# Altium schematic symbol library jlcpcb_2025_04_capacitors_extended_0402.schlib: 3594 symbols (part 15 of 20) (continued)
## GRM155C80G684KE19D (continued)
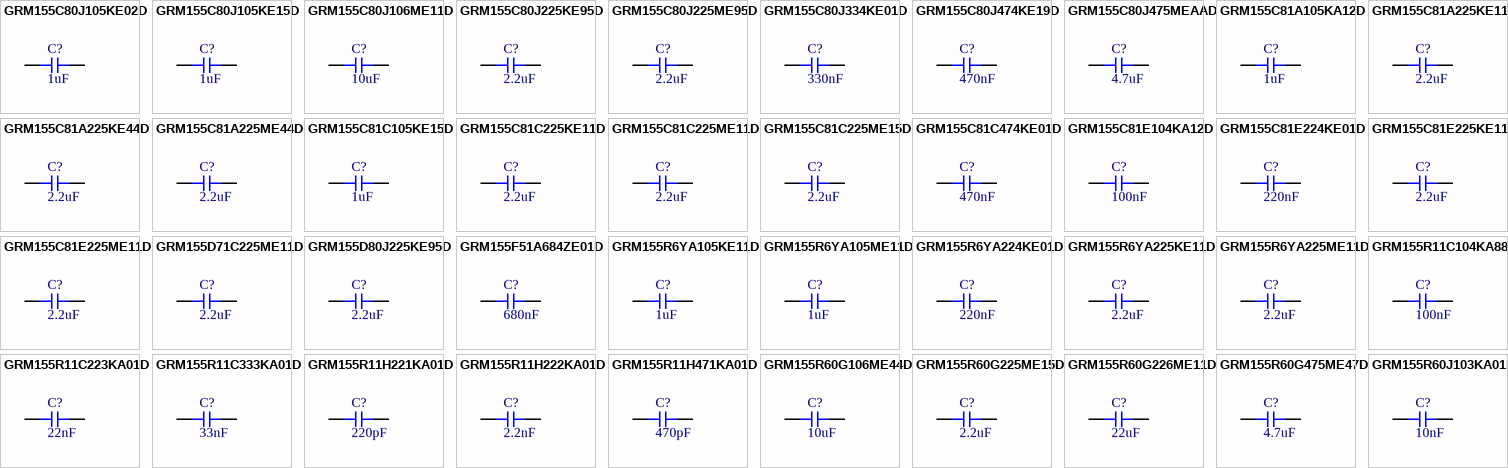
[diagram p66: symbols GRM155C80J105KE02D to GRM155R60J103KA01D]

## GRM155C80J105KE02D
designator C?  Capacitance: 1uF  (hidden comment: *)
Capacitor, Ceramic (MLCC), 1uF, ±10%, ±10%, SMD 0402; Manufacturer: Murata Electronics; Manufacturer Part Number: GRM155C80J105KE02D; Package Size: 0402; JLCPCB Basic Part: No; JLCPCB Part Number: C882537; Supplier 1: LCSC; Category: Capacitors - MLCC; Supplier Part Number 1: C882537; Tolerance: ±10%; RoHS: Yes; ComponentLink1Description: Datasheet; ComponentLink1URL: https://wmsc.lcsc.com/wmsc/upload/file/pdf/v2/lcsc/2201242130_Murata-Electronics-GRM155C80J105KE02D_C882537.pdf; ComponentLink2Description: JLCPCB Part URL; ComponentLink2URL: https://jlcpcb.com/partdetail/C882537; ComponentLink3Description: LCSC Part URL; ComponentLink3URL: https://lcsc.com/product-detail/Multilayer-Ceramic-Capacitors-MLCC---SMD-SMT_Murata-Electronics-Murata-Electronics-GRM155C80J105KE02D_C882537.html
footprint CAP-0402 (0402 (1005M) Capacitor)
pins: 1, 2

## GRM155C80J105KE15D
designator C?  Capacitance: 1uF  (hidden comment: *)
Capacitor, Ceramic (MLCC), 1uF, ±10%, 6.3V, X6S, ±10%, SMD 0402; Manufacturer: Murata Electronics; Manufacturer Part Number: GRM155C80J105KE15D; Package Size: 0402; JLCPCB Basic Part: No; JLCPCB Part Number: C162158; Supplier 1: LCSC; Category: Capacitors - MLCC; Supplier Part Number 1: C162158; Tolerance: ±10%; Voltage Rating: 6.3V; Temperature Coefficient: X6S; RoHS: Yes; ComponentLink1Description: Datasheet; ComponentLink1URL: https://wmsc.lcsc.com/wmsc/upload/file/pdf/v2/lcsc/1912111437_Murata-Electronics-GRM155C80J105KE15D_C162158.pdf; ComponentLink2Description: JLCPCB Part URL; ComponentLink2URL: https://jlcpcb.com/partdetail/C162158; ComponentLink3Description: LCSC Part URL; ComponentLink3URL: https://lcsc.com/product-detail/Multilayer-Ceramic-Capacitors-MLCC---SMD-SMT_Murata-Electronics-Murata-Electronics-GRM155C80J105KE15D_C162158.html
footprint CAP-0402 (0402 (1005M) Capacitor)
pins: 1, 2

## GRM155C80J106ME11D
designator C?  Capacitance: 10uF  (hidden comment: *)
Capacitor, Ceramic (MLCC), 10uF, ±20%, 6.3V, X6S, ±20%, SMD 0402; Manufacturer: Murata Electronics; Manufacturer Part Number: GRM155C80J106ME11D; Package Size: 0402; JLCPCB Basic Part: No; JLCPCB Part Number: C237279; Supplier 1: LCSC; Category: Capacitors - MLCC; Supplier Part Number 1: C237279; Tolerance: ±20%; Voltage Rating: 6.3V; Temperature Coefficient: X6S; RoHS: Yes; ComponentLink1Description: Datasheet; ComponentLink1URL: https://wmsc.lcsc.com/wmsc/upload/file/pdf/v2/lcsc/2304140030_Murata-Electronics-GRM155C80J106ME11D_C237279.pdf; ComponentLink2Description: JLCPCB Part URL; ComponentLink2URL: https://jlcpcb.com/partdetail/C237279; ComponentLink3Description: LCSC Part URL; ComponentLink3URL: https://lcsc.com/product-detail/Multilayer-Ceramic-Capacitors-MLCC---SMD-SMT_Murata-Electronics-Murata-Electronics-GRM155C80J106ME11D_C237279.html
footprint CAP-0402 (0402 (1005M) Capacitor)
pins: 1, 2

## GRM155C80J225KE95D
designator C?  Capacitance: 2.2uF  (hidden comment: *)
Capacitor, Ceramic (MLCC), 2.2uF, ±10%, 6.3V, X6S, ±10%, SMD 0402; Manufacturer: Murata Electronics; Manufacturer Part Number: GRM155C80J225KE95D; Package Size: 0402; JLCPCB Basic Part: No; JLCPCB Part Number: C521077; Supplier 1: LCSC; Category: Capacitors - MLCC; Supplier Part Number 1: C521077; Tolerance: ±10%; Voltage Rating: 6.3V; Temperature Coefficient: X6S; RoHS: Yes; ComponentLink1Description: Datasheet; ComponentLink1URL: https://wmsc.lcsc.com/wmsc/upload/file/pdf/v2/lcsc/2304140030_Murata-Electronics-GRM155C80J225KE95D_C521077.pdf; ComponentLink2Description: JLCPCB Part URL; ComponentLink2URL: https://jlcpcb.com/partdetail/C521077; ComponentLink3Description: LCSC Part URL; ComponentLink3URL: https://lcsc.com/product-detail/Multilayer-Ceramic-Capacitors-MLCC---SMD-SMT_Murata-Electronics-Murata-Electronics-GRM155C80J225KE95D_C521077.html
footprint CAP-0402 (0402 (1005M) Capacitor)
pins: 1, 2

## GRM155C80J225ME95D
designator C?  Capacitance: 2.2uF  (hidden comment: *)
Capacitor, Ceramic (MLCC), 2.2uF, ±20%, 6.3V, X6S, ±20%, SMD 0402; Manufacturer: Murata Electronics; Manufacturer Part Number: GRM155C80J225ME95D; Package Size: 0402; JLCPCB Basic Part: No; JLCPCB Part Number: C464978; Supplier 1: LCSC; Category: Capacitors - MLCC; Supplier Part Number 1: C464978; Tolerance: ±20%; Voltage Rating: 6.3V; Temperature Coefficient: X6S; RoHS: Yes; ComponentLink1Description: Datasheet; ComponentLink1URL: https://wmsc.lcsc.com/wmsc/upload/file/pdf/v2/lcsc/2001071207_Murata-Electronics-GRM155C80J225ME95D_C464978.pdf; ComponentLink2Description: JLCPCB Part URL; ComponentLink2URL: https://jlcpcb.com/partdetail/C464978; ComponentLink3Description: LCSC Part URL; ComponentLink3URL: https://lcsc.com/product-detail/Multilayer-Ceramic-Capacitors-MLCC---SMD-SMT_Murata-Electronics-Murata-Electronics-GRM155C80J225ME95D_C464978.html
footprint CAP-0402 (0402 (1005M) Capacitor)
pins: 1, 2

## GRM155C80J334KE01D
designator C?  Capacitance: 330nF  (hidden comment: *)
Capacitor, Ceramic (MLCC), 330nF, ±10%, 6.3V, X6S, ±10%, SMD 0402; Manufacturer: Murata Electronics; Manufacturer Part Number: GRM155C80J334KE01D; Package Size: 0402; JLCPCB Basic Part: No; JLCPCB Part Number: C913655; Supplier 1: LCSC; Category: Capacitors - MLCC; Supplier Part Number 1: C913655; Tolerance: ±10%; Voltage Rating: 6.3V; Temperature Coefficient: X6S; RoHS: Yes; ComponentLink1Description: Datasheet; ComponentLink1URL: https://wmsc.lcsc.com/wmsc/upload/file/pdf/v2/lcsc/2201131300_Murata-Electronics-GRM155C80J334KE01D_C913655.pdf; ComponentLink2Description: JLCPCB Part URL; ComponentLink2URL: https://jlcpcb.com/partdetail/C913655; ComponentLink3Description: LCSC Part URL; ComponentLink3URL: https://lcsc.com/product-detail/Multilayer-Ceramic-Capacitors-MLCC---SMD-SMT_Murata-Electronics-Murata-Electronics-GRM155C80J334KE01D_C913655.html
footprint CAP-0402 (0402 (1005M) Capacitor)
pins: 1, 2

## GRM155C80J474KE19D
designator C?  Capacitance: 470nF  (hidden comment: *)
Capacitor, Ceramic (MLCC), 470nF, ±10%, 6.3V, X6S, ±10%, SMD 0402; Manufacturer: Murata Electronics; Manufacturer Part Number: GRM155C80J474KE19D; Package Size: 0402; JLCPCB Basic Part: No; JLCPCB Part Number: C162159; Supplier 1: LCSC; Category: Capacitors - MLCC; Supplier Part Number 1: C162159; Tolerance: ±10%; Voltage Rating: 6.3V; Temperature Coefficient: X6S; RoHS: Yes; ComponentLink1Description: Datasheet; ComponentLink1URL: https://wmsc.lcsc.com/wmsc/upload/file/pdf/v2/lcsc/2304140030_Murata-Electronics-GRM155C80J474KE19D_C162159.pdf; ComponentLink2Description: JLCPCB Part URL; ComponentLink2URL: https://jlcpcb.com/partdetail/C162159; ComponentLink3Description: LCSC Part URL; ComponentLink3URL: https://lcsc.com/product-detail/Multilayer-Ceramic-Capacitors-MLCC---SMD-SMT_Murata-Electronics-Murata-Electronics-GRM155C80J474KE19D_C162159.html
footprint CAP-0402 (0402 (1005M) Capacitor)
pins: 1, 2

## GRM155C80J475MEAAD
designator C?  Capacitance: 4.7uF  (hidden comment: *)
Capacitor, Ceramic (MLCC), 4.7uF, ±20%, 6.3V, X6S, ±20%, SMD 0402; Manufacturer: Murata Electronics; Manufacturer Part Number: GRM155C80J475MEAAD; Package Size: 0402; JLCPCB Basic Part: No; JLCPCB Part Number: C464981; Supplier 1: LCSC; Category: Capacitors - MLCC; Supplier Part Number 1: C464981; Tolerance: ±20%; Voltage Rating: 6.3V; Temperature Coefficient: X6S; RoHS: Yes; ComponentLink1Description: Datasheet; ComponentLink1URL: https://wmsc.lcsc.com/wmsc/upload/file/pdf/v2/lcsc/1912111437_Murata-Electronics-GRM155C80J475MEAAD_C464981.pdf; ComponentLink2Description: JLCPCB Part URL; ComponentLink2URL: https://jlcpcb.com/partdetail/C464981; ComponentLink3Description: LCSC Part URL; ComponentLink3URL: https://lcsc.com/product-detail/Multilayer-Ceramic-Capacitors-MLCC---SMD-SMT_Murata-Electronics-Murata-Electronics-GRM155C80J475MEAAD_C464981.html
footprint CAP-0402 (0402 (1005M) Capacitor)
pins: 1, 2

## GRM155C81A105KA12D
designator C?  Capacitance: 1uF  (hidden comment: *)
Capacitor, Ceramic (MLCC), 1uF, ±10%, 10V, X6S, ±10%, SMD 0402; Manufacturer: Murata Electronics; Manufacturer Part Number: GRM155C81A105KA12D; Package Size: 0402; JLCPCB Basic Part: No; JLCPCB Part Number: C162161; Supplier 1: LCSC; Category: Capacitors - MLCC; Supplier Part Number 1: C162161; Tolerance: ±10%; Voltage Rating: 10V; Temperature Coefficient: X6S; RoHS: Yes; ComponentLink1Description: Datasheet; ComponentLink1URL: https://wmsc.lcsc.com/wmsc/upload/file/pdf/v2/lcsc/2201242300_Murata-Electronics-GRM155C81A105KA12D_C162161.pdf; ComponentLink2Description: JLCPCB Part URL; ComponentLink2URL: https://jlcpcb.com/partdetail/C162161; ComponentLink3Description: LCSC Part URL; ComponentLink3URL: https://lcsc.com/product-detail/Multilayer-Ceramic-Capacitors-MLCC---SMD-SMT_Murata-Electronics-Murata-Electronics-GRM155C81A105KA12D_C162161.html
footprint CAP-0402 (0402 (1005M) Capacitor)
pins: 1, 2

## GRM155C81A225KE11D
designator C?  Capacitance: 2.2uF  (hidden comment: *)
Capacitor, Ceramic (MLCC), 2.2uF, ±10%, 10V, X6S, ±10%, SMD 0402; Manufacturer: Murata Electronics; Manufacturer Part Number: GRM155C81A225KE11D; Package Size: 0402; JLCPCB Basic Part: No; JLCPCB Part Number: C464979; Supplier 1: LCSC; Category: Capacitors - MLCC; Supplier Part Number 1: C464979; Tolerance: ±10%; Voltage Rating: 10V; Temperature Coefficient: X6S; RoHS: Yes; ComponentLink1Description: Datasheet; ComponentLink1URL: https://wmsc.lcsc.com/wmsc/upload/file/pdf/v2/lcsc/2001041604_Murata-Electronics-GRM155C81A225KE11D_C464979.pdf; ComponentLink2Description: JLCPCB Part URL; ComponentLink2URL: https://jlcpcb.com/partdetail/C464979; ComponentLink3Description: LCSC Part URL; ComponentLink3URL: https://lcsc.com/product-detail/Multilayer-Ceramic-Capacitors-MLCC---SMD-SMT_Murata-Electronics-Murata-Electronics-GRM155C81A225KE11D_C464979.html
footprint CAP-0402 (0402 (1005M) Capacitor)
pins: 1, 2

## GRM155C81A225KE44D
designator C?  Capacitance: 2.2uF  (hidden comment: *)
Capacitor, Ceramic (MLCC), 2.2uF, ±10%, 10V, X6S, ±10%, SMD 0402; Manufacturer: Murata Electronics; Manufacturer Part Number: GRM155C81A225KE44D; Package Size: 0402; JLCPCB Basic Part: No; JLCPCB Part Number: C576451; Supplier 1: LCSC; Category: Capacitors - MLCC; Supplier Part Number 1: C576451; Tolerance: ±10%; Voltage Rating: 10V; Temperature Coefficient: X6S; RoHS: Yes; ComponentLink1Description: Datasheet; ComponentLink1URL: https://wmsc.lcsc.com/wmsc/upload/file/pdf/v2/lcsc/2308111635_Murata-Electronics-GRM155C81A225KE44D_C576451.pdf; ComponentLink2Description: JLCPCB Part URL; ComponentLink2URL: https://jlcpcb.com/partdetail/C576451; ComponentLink3Description: LCSC Part URL; ComponentLink3URL: https://lcsc.com/product-detail/Multilayer-Ceramic-Capacitors-MLCC---SMD-SMT_Murata-Electronics-Murata-Electronics-GRM155C81A225KE44D_C576451.html
footprint CAP-0402 (0402 (1005M) Capacitor)
pins: 1, 2

## GRM155C81A225ME44D
designator C?  Capacitance: 2.2uF  (hidden comment: *)
Capacitor, Ceramic (MLCC), 2.2uF, ±20%, 10V, X6S, ±20%, SMD 0402; Manufacturer: Murata Electronics; Manufacturer Part Number: GRM155C81A225ME44D; Package Size: 0402; JLCPCB Basic Part: No; JLCPCB Part Number: C710863; Supplier 1: LCSC; Category: Capacitors - MLCC; Supplier Part Number 1: C710863; Tolerance: ±20%; Voltage Rating: 10V; Temperature Coefficient: X6S; RoHS: Yes; ComponentLink1Description: Datasheet; ComponentLink1URL: https://wmsc.lcsc.com/wmsc/upload/file/pdf/v2/lcsc/2210190600_Murata-Electronics-GRM155C81A225ME44D_C710863.pdf; ComponentLink2Description: JLCPCB Part URL; ComponentLink2URL: https://jlcpcb.com/partdetail/C710863; ComponentLink3Description: LCSC Part URL; ComponentLink3URL: https://lcsc.com/product-detail/Multilayer-Ceramic-Capacitors-MLCC---SMD-SMT_Murata-Electronics-Murata-Electronics-GRM155C81A225ME44D_C710863.html
footprint CAP-0402 (0402 (1005M) Capacitor)
pins: 1, 2

## GRM155C81C105KE15D
designator C?  Capacitance: 1uF  (hidden comment: *)
Capacitor, Ceramic (MLCC), 1uF, ±10%, 16V, X6S, ±10%, SMD 0402; Manufacturer: Murata Electronics; Manufacturer Part Number: GRM155C81C105KE15D; Package Size: 0402; JLCPCB Basic Part: No; JLCPCB Part Number: C710864; Supplier 1: LCSC; Category: Capacitors - MLCC; Supplier Part Number 1: C710864; Tolerance: ±10%; Voltage Rating: 16V; Temperature Coefficient: X6S; RoHS: Yes; ComponentLink1Description: Datasheet; ComponentLink1URL: https://wmsc.lcsc.com/wmsc/upload/file/pdf/v2/lcsc/2308111635_Murata-Electronics-GRM155C81C105KE15D_C710864.pdf; ComponentLink2Description: JLCPCB Part URL; ComponentLink2URL: https://jlcpcb.com/partdetail/C710864; ComponentLink3Description: LCSC Part URL; ComponentLink3URL: https://lcsc.com/product-detail/Multilayer-Ceramic-Capacitors-MLCC---SMD-SMT_Murata-Electronics-Murata-Electronics-GRM155C81C105KE15D_C710864.html
footprint CAP-0402 (0402 (1005M) Capacitor)
pins: 1, 2

## GRM155C81C225KE11D
designator C?  Capacitance: 2.2uF  (hidden comment: *)
Capacitor, Ceramic (MLCC), 2.2uF, ±10%, 16V, X6S, ±10%, SMD 0402; Manufacturer: Murata Electronics; Manufacturer Part Number: GRM155C81C225KE11D; Package Size: 0402; JLCPCB Basic Part: No; JLCPCB Part Number: C437523; Supplier 1: LCSC; Category: Capacitors - MLCC; Supplier Part Number 1: C437523; Tolerance: ±10%; Voltage Rating: 16V; Temperature Coefficient: X6S; RoHS: Yes; ComponentLink1Description: Datasheet; ComponentLink1URL: https://wmsc.lcsc.com/wmsc/upload/file/pdf/v2/lcsc/2304140030_Murata-Electronics-GRM155C81C225KE11D_C437523.pdf; ComponentLink2Description: JLCPCB Part URL; ComponentLink2URL: https://jlcpcb.com/partdetail/C437523; ComponentLink3Description: LCSC Part URL; ComponentLink3URL: https://lcsc.com/product-detail/Multilayer-Ceramic-Capacitors-MLCC---SMD-SMT_Murata-Electronics-Murata-Electronics-GRM155C81C225KE11D_C437523.html
footprint CAP-0402 (0402 (1005M) Capacitor)
pins: 1, 2

## GRM155C81C225ME11D
designator C?  Capacitance: 2.2uF  (hidden comment: *)
Capacitor, Ceramic (MLCC), 2.2uF, ±20%, 16V, X6S, ±20%, SMD 0402; Manufacturer: Murata Electronics; Manufacturer Part Number: GRM155C81C225ME11D; Package Size: 0402; JLCPCB Basic Part: No; JLCPCB Part Number: C212615; Supplier 1: LCSC; Category: Capacitors - MLCC; Supplier Part Number 1: C212615; Tolerance: ±20%; Voltage Rating: 16V; Temperature Coefficient: X6S; RoHS: Yes; ComponentLink1Description: Datasheet; ComponentLink1URL: https://wmsc.lcsc.com/wmsc/upload/file/pdf/v2/lcsc/1811081534_Murata-Electronics-GRM155C81C225ME11D_C212615.pdf; ComponentLink2Description: JLCPCB Part URL; ComponentLink2URL: https://jlcpcb.com/partdetail/C212615; ComponentLink3Description: LCSC Part URL; ComponentLink3URL: https://lcsc.com/product-detail/Multilayer-Ceramic-Capacitors-MLCC---SMD-SMT_Murata-Electronics-Murata-Electronics-GRM155C81C225ME11D_C212615.html
footprint CAP-0402 (0402 (1005M) Capacitor)
pins: 1, 2

## GRM155C81C225ME15D
designator C?  Capacitance: 2.2uF  (hidden comment: *)
Capacitor, Ceramic (MLCC), 2.2uF, ±20%, 16V, X6S, ±20%, SMD 0402; Manufacturer: Murata Electronics; Manufacturer Part Number: GRM155C81C225ME15D; Package Size: 0402; JLCPCB Basic Part: No; JLCPCB Part Number: C710865; Supplier 1: LCSC; Category: Capacitors - MLCC; Supplier Part Number 1: C710865; Tolerance: ±20%; Voltage Rating: 16V; Temperature Coefficient: X6S; RoHS: Yes; ComponentLink1Description: Datasheet; ComponentLink1URL: https://wmsc.lcsc.com/wmsc/upload/file/pdf/v2/lcsc/2104301136_Murata-Electronics-GRM155C81C225ME15D_C710865.pdf; ComponentLink2Description: JLCPCB Part URL; ComponentLink2URL: https://jlcpcb.com/partdetail/C710865; ComponentLink3Description: LCSC Part URL; ComponentLink3URL: https://lcsc.com/product-detail/Multilayer-Ceramic-Capacitors-MLCC---SMD-SMT_Murata-Electronics-Murata-Electronics-GRM155C81C225ME15D_C710865.html
footprint CAP-0402 (0402 (1005M) Capacitor)
pins: 1, 2

## GRM155C81C474KE01D
designator C?  Capacitance: 470nF  (hidden comment: *)
Capacitor, Ceramic (MLCC), 470nF, ±10%, 16V, X6S, ±10%, SMD 0402; Manufacturer: Murata Electronics; Manufacturer Part Number: GRM155C81C474KE01D; Package Size: 0402; JLCPCB Basic Part: No; JLCPCB Part Number: C162162; Supplier 1: LCSC; Category: Capacitors - MLCC; Supplier Part Number 1: C162162; Tolerance: ±10%; Voltage Rating: 16V; Temperature Coefficient: X6S; RoHS: Yes; ComponentLink1Description: Datasheet; ComponentLink1URL: https://wmsc.lcsc.com/wmsc/upload/file/pdf/v2/lcsc/2304140030_Murata-Electronics-GRM155C81C474KE01D_C162162.pdf; ComponentLink2Description: JLCPCB Part URL; ComponentLink2URL: https://jlcpcb.com/partdetail/C162162; ComponentLink3Description: LCSC Part URL; ComponentLink3URL: https://lcsc.com/product-detail/Multilayer-Ceramic-Capacitors-MLCC---SMD-SMT_Murata-Electronics-Murata-Electronics-GRM155C81C474KE01D_C162162.html
footprint CAP-0402 (0402 (1005M) Capacitor)
pins: 1, 2

## GRM155C81E104KA12D
designator C?  Capacitance: 100nF  (hidden comment: *)
Capacitor, Ceramic (MLCC), 100nF, ±10%, 25V, X6S, ±10%, SMD 0402; Manufacturer: Murata Electronics; Manufacturer Part Number: GRM155C81E104KA12D; Package Size: 0402; JLCPCB Basic Part: No; JLCPCB Part Number: C141977; Supplier 1: LCSC; Category: Capacitors - MLCC; Supplier Part Number 1: C141977; Tolerance: ±10%; Voltage Rating: 25V; Temperature Coefficient: X6S; RoHS: Yes; ComponentLink1Description: Datasheet; ComponentLink1URL: https://wmsc.lcsc.com/wmsc/upload/file/pdf/v2/lcsc/1811081524_Murata-Electronics-GRM155C81E104KA12D_C141977.pdf; ComponentLink2Description: JLCPCB Part URL; ComponentLink2URL: https://jlcpcb.com/partdetail/C141977; ComponentLink3Description: LCSC Part URL; ComponentLink3URL: https://lcsc.com/product-detail/Multilayer-Ceramic-Capacitors-MLCC---SMD-SMT_Murata-Electronics-Murata-Electronics-GRM155C81E104KA12D_C141977.html
footprint CAP-0402 (0402 (1005M) Capacitor)
pins: 1, 2

## GRM155C81E224KE01D
designator C?  Capacitance: 220nF  (hidden comment: *)
Capacitor, Ceramic (MLCC), 220nF, ±10%, 25V, X6S, ±10%, SMD 0402; Manufacturer: Murata Electronics; Manufacturer Part Number: GRM155C81E224KE01D; Package Size: 0402; JLCPCB Basic Part: No; JLCPCB Part Number: C162163; Supplier 1: LCSC; Category: Capacitors - MLCC; Supplier Part Number 1: C162163; Tolerance: ±10%; Voltage Rating: 25V; Temperature Coefficient: X6S; RoHS: Yes; ComponentLink1Description: Datasheet; ComponentLink1URL: https://wmsc.lcsc.com/wmsc/upload/file/pdf/v2/lcsc/1811081512_Murata-Electronics-GRM155C81E224KE01D_C162163.pdf; ComponentLink2Description: JLCPCB Part URL; ComponentLink2URL: https://jlcpcb.com/partdetail/C162163; ComponentLink3Description: LCSC Part URL; ComponentLink3URL: https://lcsc.com/product-detail/Multilayer-Ceramic-Capacitors-MLCC---SMD-SMT_Murata-Electronics-Murata-Electronics-GRM155C81E224KE01D_C162163.html
footprint CAP-0402 (0402 (1005M) Capacitor)
pins: 1, 2

## GRM155C81E225KE11D
designator C?  Capacitance: 2.2uF  (hidden comment: *)
Capacitor, Ceramic (MLCC), 2.2uF, ±10%, 25V, X6S, ±10%, SMD 0402; Manufacturer: Murata Electronics; Manufacturer Part Number: GRM155C81E225KE11D; Package Size: 0402; JLCPCB Basic Part: No; JLCPCB Part Number: C710866; Supplier 1: LCSC; Category: Capacitors - MLCC; Supplier Part Number 1: C710866; Tolerance: ±10%; Voltage Rating: 25V; Temperature Coefficient: X6S; RoHS: Yes; ComponentLink1Description: Datasheet; ComponentLink1URL: https://wmsc.lcsc.com/wmsc/upload/file/pdf/v2/lcsc/2111111730_Murata-Electronics-GRM155C81E225KE11D_C710866.pdf; ComponentLink2Description: JLCPCB Part URL; ComponentLink2URL: https://jlcpcb.com/partdetail/C710866; ComponentLink3Description: LCSC Part URL; ComponentLink3URL: https://lcsc.com/product-detail/Multilayer-Ceramic-Capacitors-MLCC---SMD-SMT_Murata-Electronics-Murata-Electronics-GRM155C81E225KE11D_C710866.html
footprint CAP-0402 (0402 (1005M) Capacitor)
pins: 1, 2

## GRM155C81E225ME11D
designator C?  Capacitance: 2.2uF  (hidden comment: *)
Capacitor, Ceramic (MLCC), 2.2uF, ±20%, 25V, X6S, ±20%, SMD 0402; Manufacturer: Murata Electronics; Manufacturer Part Number: GRM155C81E225ME11D; Package Size: 0402; JLCPCB Basic Part: No; JLCPCB Part Number: C710867; Supplier 1: LCSC; Category: Capacitors - MLCC; Supplier Part Number 1: C710867; Tolerance: ±20%; Voltage Rating: 25V; Temperature Coefficient: X6S; RoHS: Yes; ComponentLink1Description: Datasheet; ComponentLink1URL: https://wmsc.lcsc.com/wmsc/upload/file/pdf/v2/lcsc/2201131100_Murata-Electronics-GRM155C81E225ME11D_C710867.pdf; ComponentLink2Description: JLCPCB Part URL; ComponentLink2URL: https://jlcpcb.com/partdetail/C710867; ComponentLink3Description: LCSC Part URL; ComponentLink3URL: https://lcsc.com/product-detail/Multilayer-Ceramic-Capacitors-MLCC---SMD-SMT_Murata-Electronics-Murata-Electronics-GRM155C81E225ME11D_C710867.html
footprint CAP-0402 (0402 (1005M) Capacitor)
pins: 1, 2

## GRM155D71C225ME11D
designator C?  Capacitance: 2.2uF  (hidden comment: *)
Capacitor, Ceramic (MLCC), 2.2uF, ±20%, 16V, X7T, ±20%, SMD 0402; Manufacturer: Murata Electronics; Manufacturer Part Number: GRM155D71C225ME11D; Package Size: 0402; JLCPCB Basic Part: No; JLCPCB Part Number: C668350; Supplier 1: LCSC; Category: Capacitors - MLCC; Supplier Part Number 1: C668350; Tolerance: ±20%; Voltage Rating: 16V; Temperature Coefficient: X7T; RoHS: Yes; ComponentLink1Description: Datasheet; ComponentLink1URL: https://wmsc.lcsc.com/wmsc/upload/file/pdf/v2/lcsc/2109092030_Murata-Electronics-GRM155D71C225ME11D_C668350.pdf; ComponentLink2Description: JLCPCB Part URL; ComponentLink2URL: https://jlcpcb.com/partdetail/C668350; ComponentLink3Description: LCSC Part URL; ComponentLink3URL: https://lcsc.com/product-detail/Multilayer-Ceramic-Capacitors-MLCC---SMD-SMT_Murata-Electronics-Murata-Electronics-GRM155D71C225ME11D_C668350.html
footprint CAP-0402 (0402 (1005M) Capacitor)
pins: 1, 2

## GRM155D80J225KE95D
designator C?  Capacitance: 2.2uF  (hidden comment: *)
Capacitor, Ceramic (MLCC), 2.2uF, ±10%, 6.3V, X6T, ±10%, SMD 0402; Manufacturer: Murata Electronics; Manufacturer Part Number: GRM155D80J225KE95D; Package Size: 0402; JLCPCB Basic Part: No; JLCPCB Part Number: C907753; Supplier 1: LCSC; Category: Capacitors - MLCC; Supplier Part Number 1: C907753; Tolerance: ±10%; Voltage Rating: 6.3V; Temperature Coefficient: X6T; RoHS: Yes; ComponentLink1Description: Datasheet; ComponentLink1URL: https://wmsc.lcsc.com/wmsc/upload/file/pdf/v2/lcsc/2201242100_Murata-Electronics-GRM155D80J225KE95D_C907753.pdf; ComponentLink2Description: JLCPCB Part URL; ComponentLink2URL: https://jlcpcb.com/partdetail/C907753; ComponentLink3Description: LCSC Part URL; ComponentLink3URL: https://lcsc.com/product-detail/Multilayer-Ceramic-Capacitors-MLCC---SMD-SMT_Murata-Electronics-Murata-Electronics-GRM155D80J225KE95D_C907753.html
footprint CAP-0402 (0402 (1005M) Capacitor)
pins: 1, 2

## GRM155F51A684ZE01D
designator C?  Capacitance: 680nF  (hidden comment: *)
Capacitor, Ceramic (MLCC), 680nF, 10V, SMD 0402; Manufacturer: Murata Electronics; Manufacturer Part Number: GRM155F51A684ZE01D; Temperature Rating: -20%~+80%; Package Size: 0402; JLCPCB Basic Part: No; JLCPCB Part Number: C426052; Supplier 1: LCSC; Category: Capacitors - MLCC; Supplier Part Number 1: C426052; Voltage Rating: 10V; RoHS: Yes; ComponentLink1Description: Datasheet; ComponentLink1URL: https://wmsc.lcsc.com/wmsc/upload/file/pdf/v2/lcsc/2304140030_Murata-Electronics-GRM155F51A684ZE01D_C426052.pdf; ComponentLink2Description: JLCPCB Part URL; ComponentLink2URL: https://jlcpcb.com/partdetail/C426052; ComponentLink3Description: LCSC Part URL; ComponentLink3URL: https://lcsc.com/product-detail/Multilayer-Ceramic-Capacitors-MLCC---SMD-SMT_Murata-Electronics-Murata-Electronics-GRM155F51A684ZE01D_C426052.html
footprint CAP-0402 (0402 (1005M) Capacitor)
pins: 1, 2

## GRM155R6YA105KE11D
designator C?  Capacitance: 1uF  (hidden comment: *)
Capacitor, Ceramic (MLCC), 1uF, ±10%, 35V, X5R, ±10%, SMD 0402; Manufacturer: Murata Electronics; Manufacturer Part Number: GRM155R6YA105KE11D; Package Size: 0402; JLCPCB Basic Part: No; JLCPCB Part Number: C361059; Supplier 1: LCSC; Category: Capacitors - MLCC; Supplier Part Number 1: C361059; Tolerance: ±10%; Voltage Rating: 35V; Temperature Coefficient: X5R; RoHS: Yes; ComponentLink1Description: Datasheet; ComponentLink1URL: https://wmsc.lcsc.com/wmsc/upload/file/pdf/v2/lcsc/2012102138_Murata-Electronics-GRM155R6YA105KE11D_C361059.pdf; ComponentLink2Description: JLCPCB Part URL; ComponentLink2URL: https://jlcpcb.com/partdetail/C361059; ComponentLink3Description: LCSC Part URL; ComponentLink3URL: https://lcsc.com/product-detail/Multilayer-Ceramic-Capacitors-MLCC---SMD-SMT_Murata-Electronics-Murata-Electronics-GRM155R6YA105KE11D_C361059.html
footprint CAP-0402 (0402 (1005M) Capacitor)
pins: 1, 2

## GRM155R6YA105ME11D
designator C?  Capacitance: 1uF  (hidden comment: *)
Capacitor, Ceramic (MLCC), 1uF, ±20%, 35V, X5R, ±20%, SMD 0402; Manufacturer: Murata Electronics; Manufacturer Part Number: GRM155R6YA105ME11D; Package Size: 0402; JLCPCB Basic Part: No; JLCPCB Part Number: C910755; Supplier 1: LCSC; Category: Capacitors - MLCC; Supplier Part Number 1: C910755; Tolerance: ±20%; Voltage Rating: 35V; Temperature Coefficient: X5R; RoHS: Yes; ComponentLink1Description: Datasheet; ComponentLink1URL: https://wmsc.lcsc.com/wmsc/upload/file/pdf/v2/lcsc/2104271833_Murata-Electronics-GRM155R6YA105ME11D_C910755.pdf; ComponentLink2Description: JLCPCB Part URL; ComponentLink2URL: https://jlcpcb.com/partdetail/C910755; ComponentLink3Description: LCSC Part URL; ComponentLink3URL: https://lcsc.com/product-detail/Multilayer-Ceramic-Capacitors-MLCC---SMD-SMT_Murata-Electronics-Murata-Electronics-GRM155R6YA105ME11D_C910755.html
footprint CAP-0402 (0402 (1005M) Capacitor)
pins: 1, 2

## GRM155R6YA224KE01D
designator C?  Capacitance: 220nF  (hidden comment: *)
Capacitor, Ceramic (MLCC), 220nF, ±10%, 35V, X5R, ±10%, SMD 0402; Manufacturer: Murata Electronics; Manufacturer Part Number: GRM155R6YA224KE01D; Package Size: 0402; JLCPCB Basic Part: No; JLCPCB Part Number: C162180; Supplier 1: LCSC; Category: Capacitors - MLCC; Supplier Part Number 1: C162180; Tolerance: ±10%; Voltage Rating: 35V; Temperature Coefficient: X5R; RoHS: Yes; ComponentLink1Description: Datasheet; ComponentLink1URL: https://wmsc.lcsc.com/wmsc/upload/file/pdf/v2/lcsc/1811081513_Murata-Electronics-GRM155R6YA224KE01D_C162180.pdf; ComponentLink2Description: JLCPCB Part URL; ComponentLink2URL: https://jlcpcb.com/partdetail/C162180; ComponentLink3Description: LCSC Part URL; ComponentLink3URL: https://lcsc.com/product-detail/Multilayer-Ceramic-Capacitors-MLCC---SMD-SMT_Murata-Electronics-Murata-Electronics-GRM155R6YA224KE01D_C162180.html
footprint CAP-0402 (0402 (1005M) Capacitor)
pins: 1, 2

## GRM155R6YA225KE11D
designator C?  Capacitance: 2.2uF  (hidden comment: *)
Capacitor, Ceramic (MLCC), 2.2uF, ±10%, 35V, X5R, ±10%, SMD 0402; Manufacturer: Murata Electronics; Manufacturer Part Number: GRM155R6YA225KE11D; Package Size: 0402; JLCPCB Basic Part: No; JLCPCB Part Number: C237392; Supplier 1: LCSC; Category: Capacitors - MLCC; Supplier Part Number 1: C237392; Tolerance: ±10%; Voltage Rating: 35V; Temperature Coefficient: X5R; RoHS: Yes; ComponentLink1Description: Datasheet; ComponentLink1URL: https://wmsc.lcsc.com/wmsc/upload/file/pdf/v2/lcsc/2304140030_Murata-Electronics-GRM155R6YA225KE11D_C237392.pdf; ComponentLink2Description: JLCPCB Part URL; ComponentLink2URL: https://jlcpcb.com/partdetail/C237392; ComponentLink3Description: LCSC Part URL; ComponentLink3URL: https://lcsc.com/product-detail/Multilayer-Ceramic-Capacitors-MLCC---SMD-SMT_Murata-Electronics-Murata-Electronics-GRM155R6YA225KE11D_C237392.html
footprint CAP-0402 (0402 (1005M) Capacitor)
pins: 1, 2

## GRM155R6YA225ME11D
designator C?  Capacitance: 2.2uF  (hidden comment: *)
Capacitor, Ceramic (MLCC), 2.2uF, ±20%, 35V, X5R, ±20%, SMD 0402; Manufacturer: Murata Electronics; Manufacturer Part Number: GRM155R6YA225ME11D; Package Size: 0402; JLCPCB Basic Part: No; JLCPCB Part Number: C710880; Supplier 1: LCSC; Category: Capacitors - MLCC; Supplier Part Number 1: C710880; Tolerance: ±20%; Voltage Rating: 35V; Temperature Coefficient: X5R; RoHS: Yes; ComponentLink1Description: Datasheet; ComponentLink1URL: https://wmsc.lcsc.com/wmsc/upload/file/pdf/v2/lcsc/2210190600_Murata-Electronics-GRM155R6YA225ME11D_C710880.pdf; ComponentLink2Description: JLCPCB Part URL; ComponentLink2URL: https://jlcpcb.com/partdetail/C710880; ComponentLink3Description: LCSC Part URL; ComponentLink3URL: https://lcsc.com/product-detail/Multilayer-Ceramic-Capacitors-MLCC---SMD-SMT_Murata-Electronics-Murata-Electronics-GRM155R6YA225ME11D_C710880.html
footprint CAP-0402 (0402 (1005M) Capacitor)
pins: 1, 2

## GRM155R11C104KA88D
designator C?  Capacitance: 100nF  (hidden comment: *)
Capacitor, Ceramic (MLCC), 100nF, ±10%, 16V, R, ±10%, SMD 0402; Manufacturer: Murata Electronics; Manufacturer Part Number: GRM155R11C104KA88D; Package Size: 0402; JLCPCB Basic Part: No; JLCPCB Part Number: C464413; Supplier 1: LCSC; Category: Capacitors - MLCC; Supplier Part Number 1: C464413; Tolerance: ±10%; Voltage Rating: 16V; Temperature Coefficient: R; RoHS: Yes; ComponentLink1Description: Datasheet; ComponentLink1URL: https://wmsc.lcsc.com/wmsc/upload/file/pdf/v2/lcsc/2304140030_Murata-Electronics-GRM155R11C104KA88D_C464413.pdf; ComponentLink2Description: JLCPCB Part URL; ComponentLink2URL: https://jlcpcb.com/partdetail/C464413; ComponentLink3Description: LCSC Part URL; ComponentLink3URL: https://lcsc.com/product-detail/Multilayer-Ceramic-Capacitors-MLCC---SMD-SMT_Murata-Electronics-Murata-Electronics-GRM155R11C104KA88D_C464413.html
footprint CAP-0402 (0402 (1005M) Capacitor)
pins: 1, 2

## GRM155R11C223KA01D
designator C?  Capacitance: 22nF  (hidden comment: *)
Capacitor, Ceramic (MLCC), 22nF, ±10%, 16V, ±10%, SMD 0402; Manufacturer: Murata Electronics; Manufacturer Part Number: GRM155R11C223KA01D; Package Size: 0402; JLCPCB Basic Part: No; JLCPCB Part Number: C576453; Supplier 1: LCSC; Category: Capacitors - MLCC; Supplier Part Number 1: C576453; Tolerance: ±10%; Voltage Rating: 16V; RoHS: Yes; ComponentLink1Description: Datasheet; ComponentLink1URL: https://wmsc.lcsc.com/wmsc/upload/file/pdf/v2/lcsc/2109092030_Murata-Electronics-GRM155R11C223KA01D_C576453.pdf; ComponentLink2Description: JLCPCB Part URL; ComponentLink2URL: https://jlcpcb.com/partdetail/C576453; ComponentLink3Description: LCSC Part URL; ComponentLink3URL: https://lcsc.com/product-detail/Multilayer-Ceramic-Capacitors-MLCC---SMD-SMT_Murata-Electronics-Murata-Electronics-GRM155R11C223KA01D_C576453.html
footprint CAP-0402 (0402 (1005M) Capacitor)
pins: 1, 2

## GRM155R11C333KA01D
designator C?  Capacitance: 33nF  (hidden comment: *)
Capacitor, Ceramic (MLCC), 33nF, ±10%, 16V, R, ±10%, SMD 0402; Manufacturer: Murata Electronics; Manufacturer Part Number: GRM155R11C333KA01D; Package Size: 0402; JLCPCB Basic Part: No; JLCPCB Part Number: C471375; Supplier 1: LCSC; Category: Capacitors - MLCC; Supplier Part Number 1: C471375; Tolerance: ±10%; Voltage Rating: 16V; Temperature Coefficient: R; RoHS: Yes; ComponentLink1Description: Datasheet; ComponentLink1URL: https://wmsc.lcsc.com/wmsc/upload/file/pdf/v2/lcsc/2308111635_Murata-Electronics-GRM155R11C333KA01D_C471375.pdf; ComponentLink2Description: JLCPCB Part URL; ComponentLink2URL: https://jlcpcb.com/partdetail/C471375; ComponentLink3Description: LCSC Part URL; ComponentLink3URL: https://lcsc.com/product-detail/Multilayer-Ceramic-Capacitors-MLCC---SMD-SMT_Murata-Electronics-Murata-Electronics-GRM155R11C333KA01D_C471375.html
footprint CAP-0402 (0402 (1005M) Capacitor)
pins: 1, 2

## GRM155R11H221KA01D
designator C?  Capacitance: 220pF  (hidden comment: *)
Capacitor, Ceramic (MLCC), 220pF, ±10%, 50V, X7R, ±10%, SMD 0402; Manufacturer: Murata Electronics; Manufacturer Part Number: GRM155R11H221KA01D; Package Size: 0402; JLCPCB Basic Part: No; JLCPCB Part Number: C162166; Supplier 1: LCSC; Category: Capacitors - MLCC; Supplier Part Number 1: C162166; Tolerance: ±10%; Voltage Rating: 50V; Temperature Coefficient: X7R; RoHS: Yes; ComponentLink1Description: Datasheet; ComponentLink1URL: https://wmsc.lcsc.com/wmsc/upload/file/pdf/v2/lcsc/2108182030_Murata-Electronics-GRM155R11H221KA01D_C162166.pdf; ComponentLink2Description: JLCPCB Part URL; ComponentLink2URL: https://jlcpcb.com/partdetail/C162166; ComponentLink3Description: LCSC Part URL; ComponentLink3URL: https://lcsc.com/product-detail/Multilayer-Ceramic-Capacitors-MLCC---SMD-SMT_Murata-Electronics-Murata-Electronics-GRM155R11H221KA01D_C162166.html
footprint CAP-0402 (0402 (1005M) Capacitor)
pins: 1, 2

## GRM155R11H222KA01D
designator C?  Capacitance: 2.2nF  (hidden comment: *)
Capacitor, Ceramic (MLCC), 2.2nF, ±10%, ±10%, SMD 0402; Manufacturer: Murata Electronics; Manufacturer Part Number: GRM155R11H222KA01D; Package Size: 0402; JLCPCB Basic Part: No; JLCPCB Part Number: C576456; Supplier 1: LCSC; Category: Capacitors - MLCC; Supplier Part Number 1: C576456; Tolerance: ±10%; RoHS: Yes; ComponentLink1Description: Datasheet; ComponentLink1URL: https://wmsc.lcsc.com/wmsc/upload/file/pdf/v2/lcsc/2105241310_Murata-Electronics-GRM155R11H222KA01D_C576456.pdf; ComponentLink2Description: JLCPCB Part URL; ComponentLink2URL: https://jlcpcb.com/partdetail/C576456; ComponentLink3Description: LCSC Part URL; ComponentLink3URL: https://lcsc.com/product-detail/Multilayer-Ceramic-Capacitors-MLCC---SMD-SMT_Murata-Electronics-Murata-Electronics-GRM155R11H222KA01D_C576456.html
footprint CAP-0402 (0402 (1005M) Capacitor)
pins: 1, 2

## GRM155R11H471KA01D
designator C?  Capacitance: 470pF  (hidden comment: *)
Capacitor, Ceramic (MLCC), 470pF, ±10%, 50V, ±10%, SMD 0402; Manufacturer: Murata Electronics; Manufacturer Part Number: GRM155R11H471KA01D; Package Size: 0402; JLCPCB Basic Part: No; JLCPCB Part Number: C576458; Supplier 1: LCSC; Category: Capacitors - MLCC; Supplier Part Number 1: C576458; Tolerance: ±10%; Voltage Rating: 50V; RoHS: Yes; ComponentLink1Description: Datasheet; ComponentLink1URL: https://wmsc.lcsc.com/wmsc/upload/file/pdf/v2/lcsc/2108182030_Murata-Electronics-GRM155R11H471KA01D_C576458.pdf; ComponentLink2Description: JLCPCB Part URL; ComponentLink2URL: https://jlcpcb.com/partdetail/C576458; ComponentLink3Description: LCSC Part URL; ComponentLink3URL: https://lcsc.com/product-detail/Multilayer-Ceramic-Capacitors-MLCC---SMD-SMT_Murata-Electronics-Murata-Electronics-GRM155R11H471KA01D_C576458.html
footprint CAP-0402 (0402 (1005M) Capacitor)
pins: 1, 2

## GRM155R60G106ME44D
designator C?  Capacitance: 10uF  (hidden comment: *)
Capacitor, Ceramic (MLCC), 10uF, ±20%, 4V, X5R, ±20%, SMD 0402; Manufacturer: Murata Electronics; Manufacturer Part Number: GRM155R60G106ME44D; Package Size: 0402; JLCPCB Basic Part: No; JLCPCB Part Number: C162167; Supplier 1: LCSC; Category: Capacitors - MLCC; Supplier Part Number 1: C162167; Tolerance: ±20%; Voltage Rating: 4V; Temperature Coefficient: X5R; RoHS: Yes; ComponentLink1Description: Datasheet; ComponentLink1URL: https://wmsc.lcsc.com/wmsc/upload/file/pdf/v2/lcsc/1811081530_Murata-Electronics-GRM155R60G106ME44D_C162167.pdf; ComponentLink2Description: JLCPCB Part URL; ComponentLink2URL: https://jlcpcb.com/partdetail/C162167; ComponentLink3Description: LCSC Part URL; ComponentLink3URL: https://lcsc.com/product-detail/Multilayer-Ceramic-Capacitors-MLCC---SMD-SMT_Murata-Electronics-Murata-Electronics-GRM155R60G106ME44D_C162167.html
footprint CAP-0402 (0402 (1005M) Capacitor)
pins: 1, 2

## GRM155R60G225ME15D
designator C?  Capacitance: 2.2uF  (hidden comment: *)
Capacitor, Ceramic (MLCC), 2.2uF, ±20%, 4V, X5R, ±20%, SMD 0402; Manufacturer: Murata Electronics; Manufacturer Part Number: GRM155R60G225ME15D; Package Size: 0402; JLCPCB Basic Part: No; JLCPCB Part Number: C441736; Supplier 1: LCSC; Category: Capacitors - MLCC; Supplier Part Number 1: C441736; Tolerance: ±20%; Voltage Rating: 4V; Temperature Coefficient: X5R; RoHS: Yes; ComponentLink1Description: Datasheet; ComponentLink1URL: https://wmsc.lcsc.com/wmsc/upload/file/pdf/v2/lcsc/2304140030_Murata-Electronics-GRM155R60G225ME15D_C441736.pdf; ComponentLink2Description: JLCPCB Part URL; ComponentLink2URL: https://jlcpcb.com/partdetail/C441736; ComponentLink3Description: LCSC Part URL; ComponentLink3URL: https://lcsc.com/product-detail/Multilayer-Ceramic-Capacitors-MLCC---SMD-SMT_Murata-Electronics-Murata-Electronics-GRM155R60G225ME15D_C441736.html
footprint CAP-0402 (0402 (1005M) Capacitor)
pins: 1, 2

## GRM155R60G226ME11D
designator C?  Capacitance: 22uF  (hidden comment: *)
Capacitor, Ceramic (MLCC), 22uF, ±20%, ±20%, SMD 0402; Manufacturer: Murata Electronics; Manufacturer Part Number: GRM155R60G226ME11D; Package Size: 0402; JLCPCB Basic Part: No; JLCPCB Part Number: C2929204; Supplier 1: LCSC; Category: Capacitors - MLCC; Supplier Part Number 1: C2929204; Tolerance: ±20%; RoHS: Yes; ComponentLink1Description: Datasheet; ComponentLink1URL: https://wmsc.lcsc.com/wmsc/upload/file/pdf/v2/lcsc/2201121400_Murata-Electronics-GRM155R60G226ME11D_C2929204.pdf; ComponentLink2Description: JLCPCB Part URL; ComponentLink2URL: https://jlcpcb.com/partdetail/C2929204; ComponentLink3Description: LCSC Part URL; ComponentLink3URL: https://lcsc.com/product-detail/Multilayer-Ceramic-Capacitors-MLCC---SMD-SMT_Murata-Electronics-Murata-Electronics-GRM155R60G226ME11D_C2929204.html
footprint CAP-0402 (0402 (1005M) Capacitor)
pins: 1, 2

## GRM155R60G475ME47D
designator C?  Capacitance: 4.7uF  (hidden comment: *)
Capacitor, Ceramic (MLCC), 4.7uF, ±20%, 4V, X5R, ±20%, SMD 0402; Manufacturer: Murata Electronics; Manufacturer Part Number: GRM155R60G475ME47D; Package Size: 0402; JLCPCB Basic Part: No; JLCPCB Part Number: C76990; Supplier 1: LCSC; Category: Capacitors - MLCC; Supplier Part Number 1: C76990; Tolerance: ±20%; Voltage Rating: 4V; Temperature Coefficient: X5R; RoHS: Yes; ComponentLink1Description: Datasheet; ComponentLink1URL: https://wmsc.lcsc.com/wmsc/upload/file/pdf/v2/lcsc/1811081613_Murata-Electronics-GRM155R60G475ME47D_C76990.pdf; ComponentLink2Description: JLCPCB Part URL; ComponentLink2URL: https://jlcpcb.com/partdetail/C76990; ComponentLink3Description: LCSC Part URL; ComponentLink3URL: https://lcsc.com/product-detail/Multilayer-Ceramic-Capacitors-MLCC---SMD-SMT_Murata-Electronics-Murata-Electronics-GRM155R60G475ME47D_C76990.html
footprint CAP-0402 (0402 (1005M) Capacitor)
pins: 1, 2

## GRM155R60J103KA01D
designator C?  Capacitance: 10nF  (hidden comment: *)
Capacitor, Ceramic (MLCC), 10nF, ±10%, 6.3V, X5R, ±10%, SMD 0402; Manufacturer: Murata Electronics; Manufacturer Part Number: GRM155R60J103KA01D; Package Size: 0402; JLCPCB Basic Part: No; JLCPCB Part Number: C710872; Supplier 1: LCSC; Category: Capacitors - MLCC; Supplier Part Number 1: C710872; Tolerance: ±10%; Voltage Rating: 6.3V; Temperature Coefficient: X5R; RoHS: Yes; ComponentLink1Description: Datasheet; ComponentLink1URL: https://wmsc.lcsc.com/wmsc/upload/file/pdf/v2/lcsc/2107272240_Murata-Electronics-GRM155R60J103KA01D_C710872.pdf; ComponentLink2Description: JLCPCB Part URL; ComponentLink2URL: https://jlcpcb.com/partdetail/C710872; ComponentLink3Description: LCSC Part URL; ComponentLink3URL: https://lcsc.com/product-detail/Multilayer-Ceramic-Capacitors-MLCC---SMD-SMT_Murata-Electronics-Murata-Electronics-GRM155R60J103KA01D_C710872.html
footprint CAP-0402 (0402 (1005M) Capacitor)
pins: 1, 2

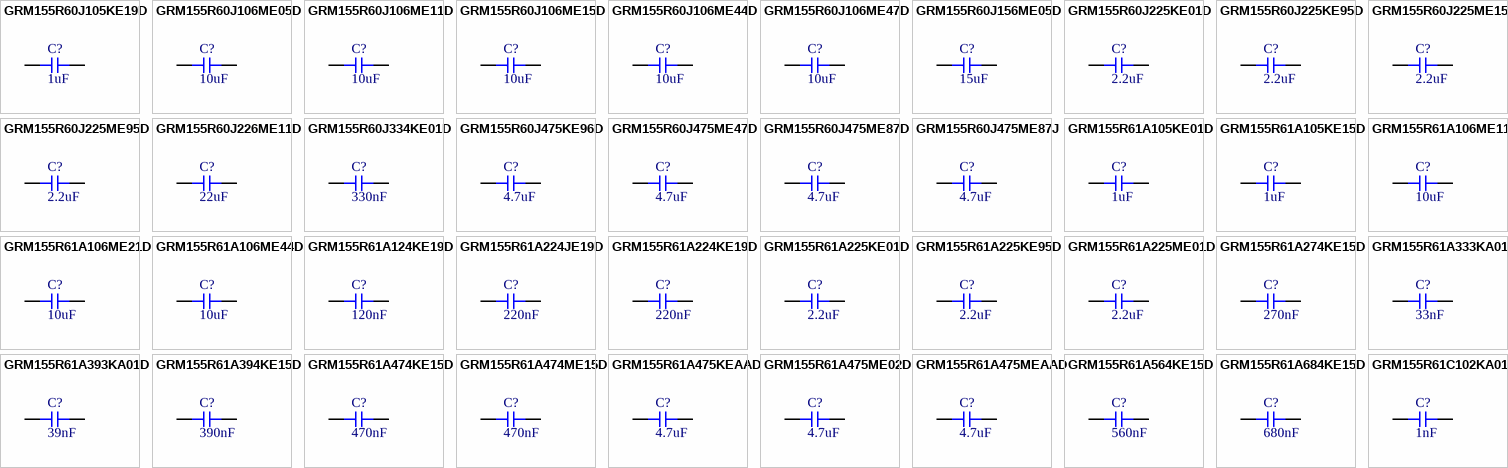
[diagram p67: symbols GRM155R60J105KE19D to GRM155R61C102KA01D]

## GRM155R60J105KE19D
designator C?  Capacitance: 1uF  (hidden comment: *)
Capacitor, Ceramic (MLCC), 1uF, ±10%, 6.3V, X5R, ±10%, SMD 0402; Manufacturer: Murata Electronics; Manufacturer Part Number: GRM155R60J105KE19D; Package Size: 0402; JLCPCB Basic Part: No; JLCPCB Part Number: C15684; Supplier 1: LCSC; Category: Capacitors - MLCC; Supplier Part Number 1: C15684; Tolerance: ±10%; Voltage Rating: 6.3V; Temperature Coefficient: X5R; RoHS: Yes; ComponentLink1Description: Datasheet; ComponentLink1URL: https://wmsc.lcsc.com/wmsc/upload/file/pdf/v2/lcsc/1811081610_Murata-Electronics-GRM155R60J105KE19D_C15684.pdf; ComponentLink2Description: JLCPCB Part URL; ComponentLink2URL: https://jlcpcb.com/partdetail/C15684; ComponentLink3Description: LCSC Part URL; ComponentLink3URL: https://lcsc.com/product-detail/Multilayer-Ceramic-Capacitors-MLCC---SMD-SMT_Murata-Electronics-Murata-Electronics-GRM155R60J105KE19D_C15684.html
footprint CAP-0402 (0402 (1005M) Capacitor)
pins: 1, 2

## GRM155R60J106ME05D
designator C?  Capacitance: 10uF  (hidden comment: *)
Capacitor, Ceramic (MLCC), 10uF, ±20%, 6.3V, X5R, ±20%, SMD 0402; Manufacturer: Murata Electronics; Manufacturer Part Number: GRM155R60J106ME05D; Package Size: 0402; JLCPCB Basic Part: No; JLCPCB Part Number: C723895; Supplier 1: LCSC; Category: Capacitors - MLCC; Supplier Part Number 1: C723895; Tolerance: ±20%; Voltage Rating: 6.3V; Temperature Coefficient: X5R; RoHS: Yes; ComponentLink1Description: Datasheet; ComponentLink1URL: https://wmsc.lcsc.com/wmsc/upload/file/pdf/v2/lcsc/2008241234_Murata-Electronics-GRM155R60J106ME05D_C723895.pdf; ComponentLink2Description: JLCPCB Part URL; ComponentLink2URL: https://jlcpcb.com/partdetail/C723895; ComponentLink3Description: LCSC Part URL; ComponentLink3URL: https://lcsc.com/product-detail/Multilayer-Ceramic-Capacitors-MLCC---SMD-SMT_Murata-Electronics-Murata-Electronics-GRM155R60J106ME05D_C723895.html
footprint CAP-0402 (0402 (1005M) Capacitor)
pins: 1, 2

## GRM155R60J106ME11D
designator C?  Capacitance: 10uF  (hidden comment: *)
Capacitor, Ceramic (MLCC), 10uF, ±20%, 6.3V, ±20%, SMD 0402; Manufacturer: Murata Electronics; Manufacturer Part Number: GRM155R60J106ME11D; Package Size: 0402; JLCPCB Basic Part: No; JLCPCB Part Number: C426118; Supplier 1: LCSC; Category: Capacitors - MLCC; Supplier Part Number 1: C426118; Tolerance: ±20%; Voltage Rating: 6.3V; RoHS: Yes; ComponentLink1Description: Datasheet; ComponentLink1URL: https://wmsc.lcsc.com/wmsc/upload/file/pdf/v2/lcsc/2001071133_Murata-Electronics-GRM155R60J106ME11D_C426118.pdf; ComponentLink2Description: JLCPCB Part URL; ComponentLink2URL: https://jlcpcb.com/partdetail/C426118; ComponentLink3Description: LCSC Part URL; ComponentLink3URL: https://lcsc.com/product-detail/Multilayer-Ceramic-Capacitors-MLCC---SMD-SMT_Murata-Electronics-Murata-Electronics-GRM155R60J106ME11D_C426118.html
footprint CAP-0402 (0402 (1005M) Capacitor)
pins: 1, 2